# Altium footprint library Supernova Connectors.PcbLib: 303 footprints (part 17 of 19)
Each footprint in its own frame and in the unit in brackets; x right, y up, seen from the top. Pads: shape width x height; smd on the part's side, far side on the other; paste and mask are expansions set on the pad; w line width, h text height; cw(c..) or ccw(c..) is an arc to the next point about the centre after c.
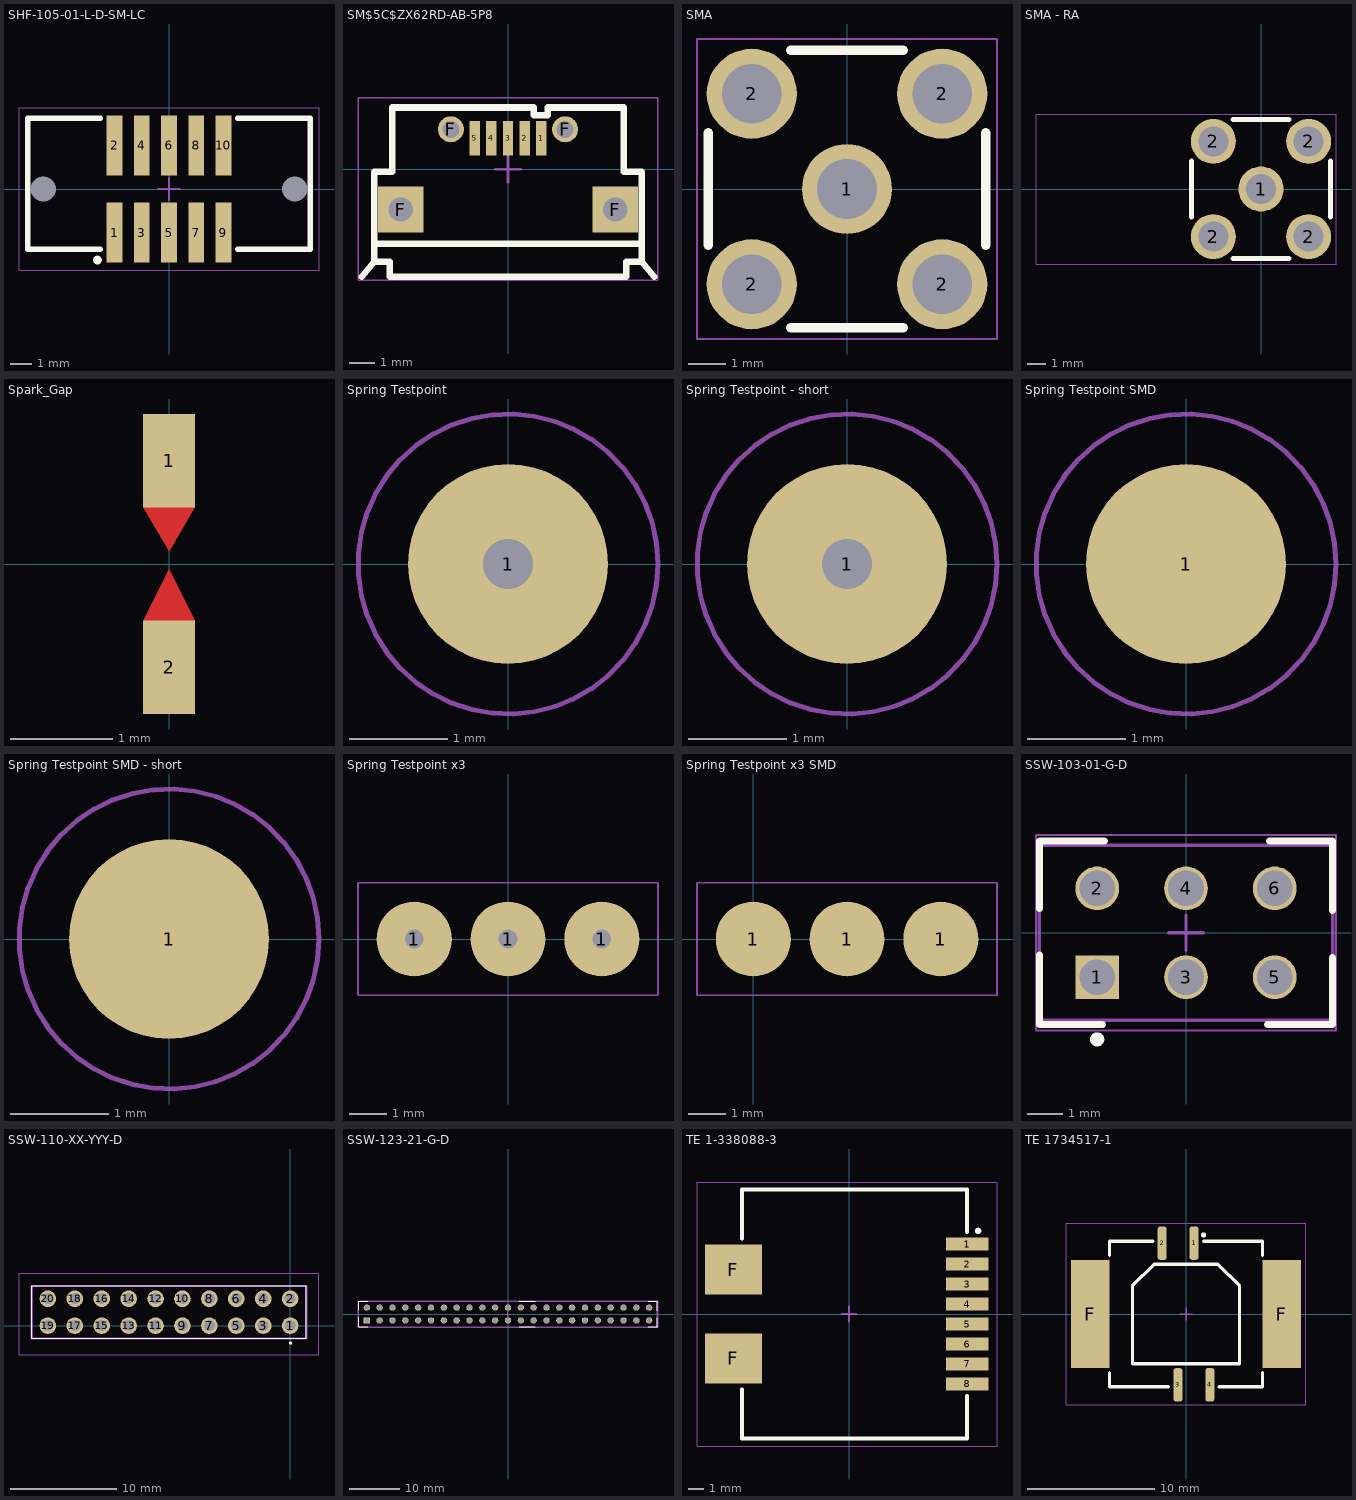
[diagram p16: the footprints below, top view; thin cyan lines are the x and y axes]

## SHF-105-01-L-D-SM-LC [mil]
pads (12):
  rect 29x110 smd: 1(-100,-80) 2(-100,80) 3(-50,-80) 4(-50,80) 5(0,-80) 6(0,80) 7(50,-80) 8(50,80) 9(100,-80) 10(100,80)
  round 0 hole 46.85 unplated: ""(-231,0) ""(231,0)
Top Overlay:
  circle w8: c-131.47,-130.55 r4
  lines w10: -125.98,-110.58 -259.84,-110.58 -259.84,130.19 -125.98,130.19 ; 125.98,-110.58 259.84,-110.58 259.84,130.19 125.98,130.19
Top Courtyard:
  lines w1.97: -275.59,-149.61 275.59,-149.61 275.59,149.61 -275.59,149.61 -275.59,-149.61
  lines w3.94: -19.68,0 19.68,0 ; 0,-19.68 0,19.69
3D body "SHF-105-01-L-D-SM-LC-TR.stp": height 215, standoff -50, extent -249.99,-120 250.01,120

## SM$5C$ZX62RD-AB-5P8 [mm]
pads (9):
  rect 0.4x1.35 smd: 1(1.3,1.212) 2(0.65,1.212) 3(0,1.212) 4(-0.65,1.212) 5(-1.3,1.212)
  rect 1.778x1.778 hole 0.94: F(-4.175,-1.562) F(4.175,-1.562)
  round 1.016 hole 0.66: F(-2.225,1.563) F(2.225,1.563)
Top Overlay:
  lines w0.254: -5.7,-4.187 -5.2,-3.587 ; 5.7,-4.187 5.2,-3.587 ; -5.2,-3.587 -4.6,-3.587 -4.6,-4.187 4.6,-4.187 4.6,-3.587 5.2,-3.587 ; -5.2,-3.587 -5.2,-2.887 ; -5.2,-2.887 5.2,-2.887 ; -5.2,-2.887 -5.2,-0.088 -4.5,-0.088 -4.5,2.412 1,2.412 1,2.113 1.55,2.113 1.55,2.412 4.5,2.412 4.5,-0.088 5.2,-0.088 5.2,-2.887 ; 5.2,-3.587 5.2,-2.887
Top Courtyard:
  lines w0.05: -5.842,-4.318 5.842,-4.318 5.842,2.794 -5.842,2.794 -5.842,-4.318
  lines w0.1: -0.5,0 0.5,0 ; 0,-0.5 0,0.5
3D body "ZX62RD-AB-5P8.stp": height 2.79, standoff -0.59, extent -4.325,-4.187 4.325,1.711

## SMA [mm]
pads (5):
  round 2.4 hole 1.6: 1(0,0) 2(-2.54,-2.54) 2(-2.54,2.54) 2(2.54,-2.54) 2(2.54,2.54)
Top Overlay:
  lines w0.254: -3.7,-1.5 -3.7,1.5 ; -1.5,-3.7 1.5,-3.7 ; -1.5,3.7 1.5,3.7 ; 3.7,-1.5 3.7,1.5
Top Courtyard:
  lines w0.05: -4,-4 -4,4 4,4 4,-4 -4,-4
  lines w0.1: -0.5,0 0.5,0 ; 0,-0.5 0,0.5
3D body "SMA-J-P-H-ST-TH1.stp": height 9.55, standoff -3.95, extent -3.5,-3.5 3.5,3.5

## SMA - RA [mm]
pads (5):
  round 2.4 hole 1.6: 1(0,0) 2(-2.54,-2.54) 2(-2.54,2.54) 2(2.54,-2.54) 2(2.54,2.54)
Top Overlay:
  lines w0.254: -3.7,-1.5 -3.7,1.5 ; -1.5,-3.7 1.5,-3.7 ; -1.5,3.7 1.5,3.7 ; 3.7,-1.5 3.7,1.5
Top Courtyard:
  lines w0.05: -12,-4 -12,4 4,4 4,-4 -12,-4
  lines w0.1: -0.5,0 0.5,0 ; 0,-0.5 0,0.5
3D body "733910083.stp": height 10.07, standoff -3.43, extent -11.625,-3.175 3.175,3.175

## Spark_Gap [mil]
pads (2):
  rrect0% 20x36.14 smd paste-19.68 mask+0: 1(0,40)
  rect 20x36.14 smd paste-19.68 mask+0: 2(0,-40)
Top Layer:
  region: 0,5 10,21.97 -10,21.97
  region: 0,-1.97 -10,-21.97 10,-21.97
Top Solder:
  rectangle: -10,-21.97 10,21.97

## Spring Testpoint [mil]
pads (1):
  round 80 hole 20: 1(0,0)
Top Courtyard:
  circle w1.97: c0,0 r60
  lines w3.94: -19.68,0 19.68,0 ; 0,-19.69 0,19.68
3D body "mill-max-0908-1-15-20-75-14-11-0.step": height 275.07, standoff -68.93, extent -36,-36 36,36

## Spring Testpoint - short [mil]
pads (1):
  round 80 hole 20: 1(0,0)
Top Courtyard:
  circle w1.97: c0,0 r60
  lines w3.94: -19.68,0 19.68,0 ; 0,-19.69 0,19.68
3D body "mill-max-0906-0-15-20-76-14-11-0.step": height 136, standoff -70, extent -36,-35.99 36,36.01

## Spring Testpoint SMD [mil]
pads (1):
  round 80 smd: 1(0,0)
Top Courtyard:
  circle w1.97: c0,0 r60
  lines w3.94: -19.68,0 19.68,0 ; 0,-19.69 0,19.68
3D body "mill-max-0907-0-20-75-14-11-0.step": height 255, standoff 0, extent -36,-36 36,36

## Spring Testpoint SMD - short [mil]
pads (1):
  round 80 smd paste-5.91: 1(0,0)
Top Courtyard:
  circle w1.97: c0,0 r60
  lines w3.94: -19.68,0 19.68,0 ; 0,-19.69 0,19.68
3D body "mill-max-0900-0-15-20-76-14-11-0.step": height 137, standoff 0, extent -35.99,-36 36.01,36

## Spring Testpoint x3 [mil]
pads (3):
  round 80 hole 20: 1(-100,0) 1(0,0) 1(100,0)
Top Courtyard:
  lines w1.97: -160,-60 160,-60 160,60 -160,60 -160,-60
  lines w3.94: -19.68,0 19.68,0 ; 0,-19.69 0,19.68
3D body "mill-max-816-22-001-10-001101.STEP": height 274.98, standoff -68.36, extent -150.03,-49.99 -50.03,50.01
3D body "mill-max-816-22-001-10-001101.STEP": height 274.98, standoff -68.36, extent -50.03,-49.99 49.97,50.01
3D body "mill-max-816-22-001-10-001101.STEP": height 274.98, standoff -68.36, extent 49.97,-49.99 149.97,50.01

## Spring Testpoint x3 SMD [mil]
pads (3):
  round 80 smd paste-5.91: 1(0,0) 1(100,0) 1(200,0)
Top Courtyard:
  lines w1.97: -60,-60 260,-60 260,60 -60,60 -60,-60
  lines w3.94: 80.31,0 119.69,0 ; 100,-19.69 100,19.68
3D body "mill-max-812-22-003-30-001101.step": height 274, standoff -1, extent -50,-50 250,50

## SSW-103-01-G-D [mm] "SSW-103-01-G-D"
height 11.05
pads (6):
  rect 1.25x1.25 hole 1.02: 1(-2.54,-1.27)
  round 1.25 hole 1.02: 2(-2.54,1.27) 3(0,-1.27) 4(0,1.27) 5(2.54,-1.27) 6(2.54,1.27)
Top Overlay:
  circle w0.203: c-2.54,-3.048 r0.102
  lines w0.2: -4.19,-0.635 -4.19,-2.624 -2.39,-2.624 ; -4.19,0.7 -4.19,2.622 -2.325,2.622 ; 2.325,-2.624 4.19,-2.624 4.19,-0.7 ; 2.39,2.622 4.19,2.622 4.19,0.635
Top 3D Body:
  lines w0.1: -4.191,-2.5 4.19,-2.5 4.19,2.5 -4.191,2.5 ; -4.19,-2.5 -4.19,2.5
Top Courtyard:
  lines w0.05: -4.29,-2.794 -4.29,2.794 4.29,2.794 4.29,-2.794 -4.29,-2.794
  lines w0.1: -0.5,0 0.5,0 ; 0,-0.5 0,0.5
3D body "SSW-103-01-G-D.stp": height 8.56, standoff -2.59, extent -4.064,-2.476 4.064,2.477

## SSW-110-XX-YYY-D [mm]
pads (20):
  round 1.57 hole 1.04: 1(0,0) 2(0,2.54) 3(-2.54,0) 4(-2.54,2.54) 5(-5.08,0) 6(-5.08,2.54) 7(-7.62,0) 8(-7.62,2.54) 9(-10.16,0) 10(-10.16,2.54) 11(-12.7,0) 12(-12.7,2.54) 13(-15.24,0) 14(-15.24,2.54) 15(-17.78,0) 16(-17.78,2.54) 17(-20.32,0) 18(-20.32,2.54) 19(-22.86,0) 20(-22.86,2.54)
Top Overlay:
  circle w0.2: c0.05,-1.65 r0.05
  lines w0.1: -24.385,-1.205 -24.385,3.745 1.525,3.745 1.525,-1.205 -24.385,-1.205
Top 3D Body:
  lines w0.2: -24.385,-1.205 -24.385,3.745 1.525,3.745 1.525,-1.205 -24.385,-1.205
Top Courtyard:
  lines w0.05: -25.585,-2.75 -25.585,4.945 2.725,4.945 2.725,-2.75 -25.585,-2.75
3D body "ESQ-110-33-L-D.stp": height 16.51, standoff -1.91, extent -24.408,-1.29 1.5,3.79

## SSW-123-21-G-D [mm] "SSW-123-21-G-D Samtech 46-pin connector"
height 11.05
pads (46):
  rect 1.25x1.25 hole 1.02: 1(-27.94,-1.27)
  round 1.25 hole 1.02: 2(-27.94,1.27) 3(-25.4,-1.27) 4(-25.4,1.27) 5(-22.86,-1.27) 6(-22.86,1.27) 7(-20.32,-1.27) 8(-20.32,1.27) 9(-17.78,-1.27) 10(-17.78,1.27) 11(-15.24,-1.27) 12(-15.24,1.27) 13(-12.7,-1.27) 14(-12.7,1.27) 15(-10.16,-1.27) 16(-10.16,1.27) 17(-7.62,-1.27) 18(-7.62,1.27) 19(-5.08,-1.27) 20(-5.08,1.27) 21(-2.54,-1.27) 22(-2.54,1.27) 23(0,-1.27) 24(0,1.27) 25(2.54,-1.27) 26(2.54,1.27) 27(5.08,-1.27) 28(5.08,1.27) 29(7.62,-1.27) 30(7.62,1.27) 31(10.16,-1.27) 32(10.16,1.27) 33(12.7,-1.27) 34(12.7,1.27) 35(15.24,-1.27) 36(15.24,1.27) 37(17.78,-1.27) 38(17.78,1.27) 39(20.32,-1.27) 40(20.32,1.27) 41(22.86,-1.27) 42(22.86,1.27) 43(25.4,-1.27) 44(25.4,1.27) 45(27.94,-1.27) 46(27.94,1.27)
Top Overlay:
  lines w0.2: -29.59,-0.635 -29.59,-2.5 -27.79,-2.5 ; -29.59,0.7 -29.59,2.5 -27.725,2.5 ; 2.208,-2.5 5.41,-2.5 ; 2.208,2.5 5.41,2.5 ; 27.725,-2.5 29.59,-2.5 29.59,-0.7 ; 27.79,2.5 29.59,2.5 29.59,0.635
Top 3D Body:
  lines w0.1: -29.59,-2.5 -29.59,2.5 29.59,2.5 29.59,-2.5 -29.59,-2.5
Top Courtyard:
  lines w0.05: -29.69,-2.6 -29.69,2.6 29.69,2.6 29.69,-2.6 -29.69,-2.6
  lines w0.1: -0.5,0 0.5,0 ; 0,-0.5 0,0.5
3D body "SSW-123-21-G-D.stp": height 8.51, standoff -2.64, extent -29.454,-2.476 29.474,2.477

## TE 1-338088-3 [mm]
pads (10):
  rect 2.675x0.8 smd: 1(7.512,4.445) 2(7.512,3.175) 3(7.512,1.905) 4(7.512,0.635) 5(7.512,-0.635) 6(7.512,-1.905) 7(7.512,-3.175) 8(7.512,-4.445)
  rect 3.625x3.15 smd paste-0.3: F(-7.338,-2.825) F(-7.338,2.825)
Top Overlay:
  circle w0.203: c8.2,5.278 r0.102
  lines w0.254: -6.8,-4.8 -6.8,-7.9 7.5,-7.9 7.5,-5.2 ; -6.8,4.8 -6.8,7.9 7.5,7.9 7.5,5.2
Top Courtyard:
  lines w0.05: -9.652,-8.382 -9.652,8.382 9.398,8.382 9.398,-8.382 -9.652,-8.382
  lines w0.1: -0.5,0 0.5,0 ; 0,-0.5 0,0.5
3D body "c-1-338088-3-y-3d.stp": height 12.7, standoff 0, extent -9.147,-7.775 8.853,7.775

## TE 1734517-1 [mm]
pads (6):
  rrect50% 0.7x2.6 smd: 1(0.63,5.55) 2(-1.87,5.55) 3(-0.63,-5.55) 4(1.87,-5.55)
  rect 3x8.5 smd: F(-7.51,0) F(7.51,0)
Top Overlay:
  circle w0.203: c1.378,6.2 r0.102
  lines w0.254: -6,-4.6 -6,-5.7 -1.4,-5.7 ; -6,4.6 -6,5.7 -2.6,5.7 ; 1.4,5.7 6,5.7 6,4.6 ; 2.6,-5.7 6,-5.7 6,-4.6 ; -4.2,-3.9 -4.2,2.2 -2.5,3.9 2.5,3.9 4.2,2.2 4.2,-3.9 -4.2,-3.9
Top Courtyard:
  lines w0.05: -9.398,-7.112 -9.398,7.112 9.398,7.112 9.398,-7.112 -9.398,-7.112
  lines w0.1: -0.5,0 0.5,0 ; 0,-0.5 0,0.5
3D body "c-1734517-1-b-3d.stp": height 13, standoff 0, extent -8.5,-6.85 8.5,6.85